# Altium footprint library connecteurs.PcbLib: 162 footprints (part 6 of 11)
Each footprint in its own frame and in the unit in brackets; x right, y up, seen from the top. Pads: shape width x height; smd on the part's side, far side on the other; paste and mask are expansions set on the pad; w line width, h text height; cw(c..) or ccw(c..) is an arc to the next point about the centre after c.
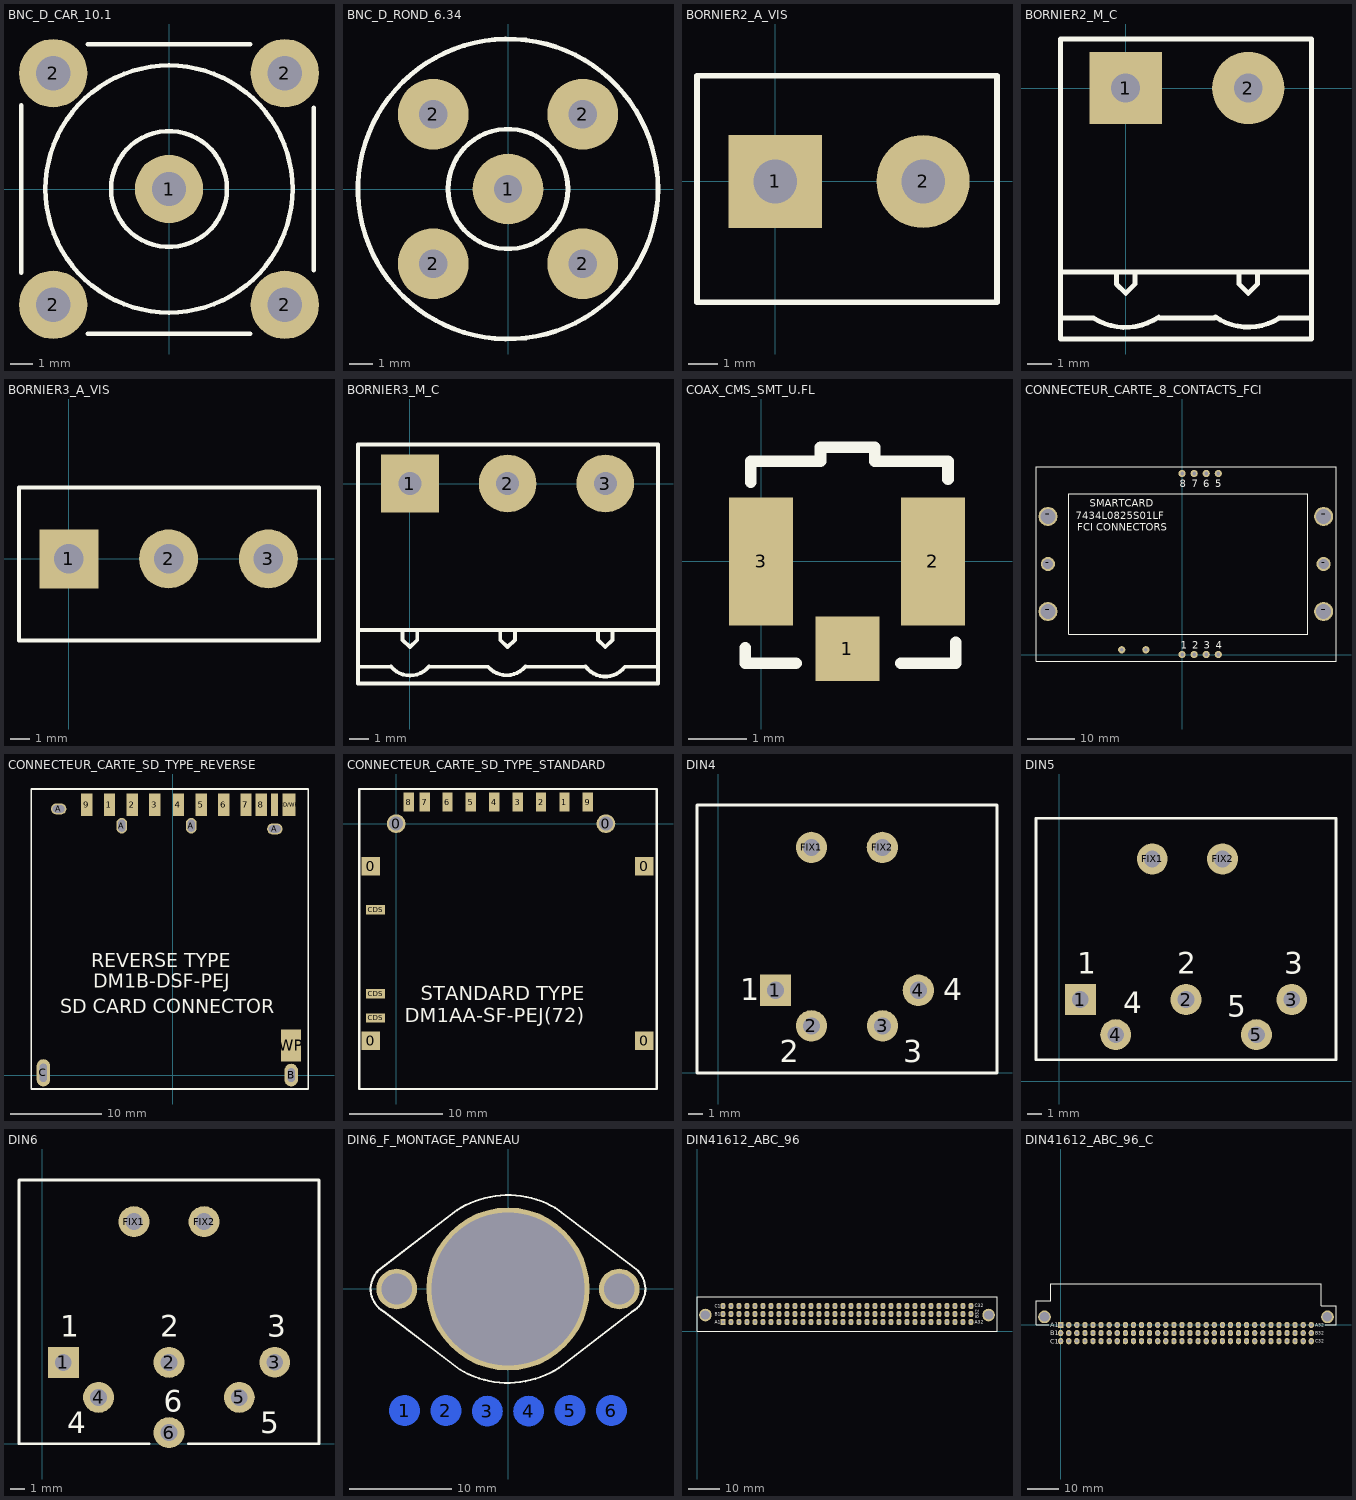
[diagram p5: the footprints below, top view; thin cyan lines are the x and y axes]

## BNC_D_CAR_10.1 [mm] "EMBASE BNC CARREE ;  DROITE ; 50R ; DIAMETRE = 9.7 mm ; ESPACEMENT BROCHES GND = 10.1 mm"
height 14
pads (5):
  round 3 hole 1.5: 1(0,0) 2(-5.08,-5.08) 2(-5.08,5.08) 2(5.08,-5.08) 2(5.08,5.08)
Top Overlay:
  circle w0.2: c0,0 r2.54
  circle w0.2: c0,0 r5.42
  lines w0.2: -6.477,-3.683 -6.477,3.683 ; -3.556,-6.35 3.556,-6.35 ; -3.556,6.35 3.556,6.35 ; 6.35,-3.556 6.35,3.556
3D body: height 22.5, standoff -4, extent -6,-6.1 6,5.9

## BNC_D_ROND_6.34 [mm] "EMBASE BNC RONDE ;  DROITE ; 50R ; DIAMETRE = 9.7 mm ; ESPACEMENT BROCHES GND = 6.34 mm"
height 13.5
pads (5):
  round 3 hole 1.2: 1(0,0) 2(-3.17,-3.17) 2(-3.17,3.17) 2(3.17,-3.17) 2(3.17,3.17)
Top Overlay:
  circle w0.2: c0,0 r6.36
  circle w0.2: c0,0 r2.54
3D body: height 17.95, standoff -4.4, extent -5.49,-5.38 5.49,5.6

## BORNIER2_A_VIS [mm] "BORNIER 2 PLOTS A VIS ; VERTICAL ; ESPACEMENT BROCHES = 5.08mm"
height 10
pads (2):
  rect 3.2x3.2 hole 1.5: 1(0,0)
  round 3.2 hole 1.5: 2(5.08,0)
Top Overlay:
  lines w0.2: -2.69,-4.15 7.62,-4.15 7.62,3.63 0.815,3.63 -2.69,3.63 -2.69,0.358 -2.69,-1.42 -2.69,-4.15
3D body: height 10, standoff -4, extent -2.5,-4 7.5,3.5

## BORNIER2_M_C [mm] "BORNIER 2 PLOTS ; MALE ; COUDE ; ESPACEMENT BROCHES = 5.08mm"
height 8.3
pads (2):
  rect 3x3 hole 1.2: 1(0,0)
  round 3 hole 1.2: 2(5.08,0)
Top Overlay:
  lines w0.2: -2.7,-9.525 -1.323,-9.525 ; -2.7,-7.62 7.7,-7.62 ; -1.323,-9.536 ccw(c-0.013,-7.493) 1.37,-9.486 ; -0.381,-7.62 -0.381,-8.128 0,-8.509 0.381,-8.128 0.381,-7.62 ; 1.397,-9.525 3.683,-9.525 ; 3.713,-9.481 ccw(c5.08,-7.493) 6.359,-9.539 ; 4.699,-7.62 4.699,-8.128 5.08,-8.509 5.461,-8.128 5.461,-7.62 ; 6.35,-9.525 7.7,-9.525 ; -2.7,-10.4 -2.7,2.032 7.7,2.032 7.7,-10.4 -2.7,-10.4
3D body: height 8.47, standoff -4, extent -2.5,-10.2 7.5,1.8

## BORNIER3_A_VIS [mm] "BORNIER 3 PLOTS A VIS ; VERTICAL ; ESPACEMENT BROCHES = 5.08mm"
height 10
pads (3):
  rect 3x3 hole 1.5: 1(0,0)
  round 3 hole 1.5: 2(5.08,0) 3(10.16,0)
Top Overlay:
  lines w0.2: -2.54,-4.16 12.74,-4.16 12.74,3.64 -2.54,3.64 -2.54,-4.16
3D body: height 10, standoff -4, extent -2.4,-4 12.6,3.5

## BORNIER3_M_C [mm] "BORNIER 3 PLOTS ; MALE ; COUDE ; ESPACEMENT BROCHES = 5.08mm"
height 8.3
pads (3):
  rect 3x3 hole 1.2: 1(0,0)
  round 3 hole 1.2: 2(5.08,0) 3(10.16,0)
Top Overlay:
  lines w0.2: -2.7,-10.4 -2.7,2.032 12.9,2.032 12.9,-10.4 -2.667,-10.4 ; -2.7,-9.525 -0.983,-9.525 ; -2.7,-7.62 12.9,-7.62 ; -0.979,-9.522 ccw(c0.002,-8.714) 0.994,-9.507 ; -0.381,-7.62 -0.381,-8.128 0,-8.509 0.381,-8.128 0.381,-7.62 ; 1.016,-9.525 4.064,-9.525 ccw(c5.028,-8.698) 6.008,-9.506 ; 4.699,-7.62 4.699,-8.128 5.08,-8.509 5.461,-8.128 5.461,-7.62 ; 6.031,-9.525 9.103,-9.525 ; 9.13,-9.506 ccw(c10.16,-8.763) 11.176,-9.525 12.9,-9.525 ; 9.779,-7.62 9.779,-8.128 10.16,-8.509 10.541,-8.128 10.541,-7.62
3D body: height 8.6, standoff -3.5, extent -2.52,-10.2 12.72,1.8

## COAX_CMS_SMT_U.FL [mm] "MICRO COAXIAL CMS UFL ; FEMELLE ; DROIT"
height 1.25
pads (3):
  rect 1.1x1.1 smd: 1(1.48,-1.5)
  rect 1.1x2.2 smd: 2(2.95,0) 3(0,0)
Top Overlay:
  lines w0.2: -0.27,-1.48 -0.27,-1.75 0.6,-1.75 ; -0.18,1.36 -0.18,1.72 1.02,1.72 1.02,1.96 1.95,1.96 1.95,1.72 3.21,1.72 3.21,1.41 ; 2.4,-1.75 3.34,-1.75 3.34,-1.39
3D body: height 1.25, standoff -0.01, extent 0,-1.5 3,1.6

## CONNECTEUR_CARTE_8_CONTACTS_FCI [mm] "CONNECTEUR DE CARTE ; 8 CONTACTS ; MALE ; A SOUDER ; PAS = 2.54 mm"
height 9
pads (16):
  round 1.524 hole 0.762: 1(0,0) 2(2.54,0) 3(5.08,0) 4(7.62,0) 5(7.62,38.1) 6(5.08,38.1) 7(2.54,38.1) 8(0,38.1) -(-12.7,1) -(-7.62,1)
  round 4 hole 3.2: -(-28.22,9.05) -(-28.22,29.05) -(29.78,9.05) -(29.78,29.05)
  round 3 hole 2.2: -(-28.22,19.05) -(29.78,19.05)
Top Overlay:
  lines w0.2: -30.734,-1.397 -30.734,39.497 32.385,39.497 32.385,-1.397 -30.734,-1.397 ; -23.876,4.318 -23.876,33.782 26.416,33.782 26.416,4.318 -23.876,4.318
  text "SMARTCARD" at -19.431,31.115 h1.52
  text "8" at -0.508,35.179 h1.52
  text "7" at 2.032,35.179 h1.52
  text "6" at 4.445,35.179 h1.52
  text "5" at 6.985,35.179 h1.52
  text "4" at 7.112,1.27 h1.52
  text "3" at 4.572,1.27 h1.52
  text "2" at 2.159,1.27 h1.52
  text "1" at -0.254,1.27 h1.52
  text "7434L0825S01LF" at -22.352,28.448 h1.52
  text "FCI CONNECTORS" at -22.098,26.035 h1.52

## CONNECTEUR_CARTE_SD_TYPE_REVERSE [mm] "CONNECTEUR MEMOIRE SD REVERSE ; 9 CONTACTS ; PAS = 2.5 mm"
height 2.9
pads (18):
  rect 1.25x2.5 smd: 1(-6.97,29.75) 2(-4.47,29.75) 3(-1.97,29.75) 4(0.625,29.75) 5(3.125,29.75) 6(5.625,29.75) 7(8.05,29.75) 8(9.75,29.75) 9(-9.47,29.75)
  oval 1.7x1.2 hole 0.8 slot 1.3 at 0 deg: A(-12.57,29.3) A(11.23,27.1)
  oval 1.2x1.7 hole 0.8 slot 1.3 at 90 deg: A(-5.62,27.45) A(2.03,27.45)
  oval 1.5x2.5 hole 0.8 slot 1.5 at 90 deg: B(13.03,0)
  oval 1.5x3 hole 0.8 slot 2 at 90 deg: C(-14.25,0.25)
  rect 0.8x2.5 smd: CD(11.2,29.75)
  rect 1.4x2.5 smd: CD/WP(12.8,29.75)
  rect 2.2x3.5 smd: WP(13.03,3.27)
Top Overlay:
  lines w0.2: 14.87,-1.53 -15.58,-1.53 -15.58,31.46 -15.55,31.49 14.91,31.49 14.91,-1.52
  text "DM1B-DSF-PEJ" at -8.76,9.61 h1.52
  text "SD CARD CONNECTOR" at -12.39,6.82 h1.52
  text "REVERSE TYPE" at -8.98,11.85 h1.52

## CONNECTEUR_CARTE_SD_TYPE_STANDARD [mm] "CONNECTEUR MEMOIRE SD STANDARD ; 9 CONTACTS ; PAS = 2.5 mm"
height 2.9
pads (18):
  rect 2x2 smd: 0(-2.7,-23.2) 0(-2.7,-4.55) 0(26.5,-23.2) 0(26.5,-4.55)
  round 2 hole 1.5: 0(0,0) 0(22.4,0)
  rect 1.1x2 smd: 1(17.975,2.3) 2(15.475,2.3) 3(12.975,2.3) 4(10.475,2.3) 5(7.975,2.3) 6(5.475,2.3) 7(3.05,2.3) 8(1.35,2.3) 9(20.475,2.3)
  rect 2x1 smd: CDS(-2.2,-20.75) CDS(-2.2,-18.15) CDS(-2.2,-9.2)
Top Overlay:
  lines w0.254: -3.96,-28.34 27.85,-28.34 27.85,3.7 -3.96,3.7 -3.96,-28.34
  text "DM1AA-SF-PEJ(72)" at 0.92,-21.22 h1.52
  text "STANDARD TYPE" at 2.61,-18.85 h1.52
3D body: height 2.9, standoff -0.55, extent -3.17,-28.04 26.83,2.46

## DIN4 [mm] "EMBASE DIN ; 4 CONTACTS ; FEMELLE ; COUDE"
height 21
pads (6):
  rect 2.2x2.2 hole 1.2: 1(4.01,5.79)
  round 2.2 hole 1.2: 2(6.53,3.3) 3(11.51,3.3) 4(14.02,5.79) FIX1(6.53,15.8) FIX2(11.5,15.8)
Top Overlay:
  lines w0.2: -1.49,0 19.53,0 19.53,16.26 19.53,18.77 -1.49,18.77 -1.49,16.42 -1.49,0
  text "1" at 1.524,5.08 h1.52
  text "2" at 4.318,0.762 h1.52
  text "3" at 12.954,0.762 h1.52
  text "4" at 15.748,5.08 h1.52
3D body: height 21.4, standoff -3.5, extent -1.35,2.6 19.35,18.6

## DIN5 [mm] "EMBASE DIN ; 5 CONTACTS ; FEMELLE ; COUDE"
height 21
pads (7):
  rect 2.2x2.2 hole 1.2: 1(1.5,5.8)
  round 2.2 hole 1.2: 2(9.02,5.8) 3(16.54,5.8) 4(4.02,3.3) 5(14.03,3.3) FIX1(6.62,15.8) FIX2(11.62,15.8)
Top Overlay:
  lines w0.2: -1.65,16.26 -1.65,1.524 19.69,1.524 19.69,16.26 19.69,18.69 -1.65,18.69 -1.65,16.26
  text "1" at 1.27,7.624 h1.52
  text "3" at 16.002,7.624 h1.52
  text "2" at 8.382,7.62 h1.52
  text "5" at 11.938,4.572 h1.52
  text "4" at 4.572,4.826 h1.52
3D body: height 21.4, standoff -3.5, extent -1.35,2.8 19.35,18.5

## DIN6 [mm] "EMBASE DIN ; 6 CONTACTS ; FEMELLE ; COUDE"
height 21
pads (8):
  rect 2.2x2.2 hole 1.2: 1(1.5,5.79)
  round 2.2 hole 1.2: 2(9.02,5.79) 3(16.54,5.8) 4(4.01,3.3) 5(14.02,3.3) 6(9.02,0.79) FIX1(6.53,15.8) FIX2(11.514,15.8)
Top Overlay:
  lines w0.2: -1.65,16.26 -1.65,0 7.62,0 ; -1.65,16.26 -1.65,18.77 19.69,18.77 19.69,16.26 19.69,0 10.414,0
  text "6" at 8.636,2.286 h1.52
  text "1" at 1.27,7.624 h1.52
  text "3" at 16.002,7.624 h1.52
  text "2" at 8.382,7.62 h1.52
  text "5" at 15.494,0.762 h1.52
  text "4" at 1.778,0.762 h1.52
3D body: height 21.4, standoff -3.5, extent -1.35,0.6 19.35,18.55

## DIN6_F_MONTAGE_PANNEAU [mm] "CONNECTEUR DIN ; 6 CONTACTS ; FEMELLE ; MONTAGE PANNEAU ; CONNEXIONS AVEC FILS SUR PCB"
height 2
pads (9):
  round 3 smd far side: 1(-10.16,-11.938) 2(-6.096,-11.938) 3(-2.032,-12) 4(2.032,-12) 5(6.096,-11.938) 6(10.16,-11.938)
  round 4 hole 3: ""(-10.922,0) ""(10.922,0)
  round 16 hole 15: ""(0,0)
Top Overlay:
  lines w0.2: -12.725,1.826 ccw(c-10.922,0) -12.211,-2.219 ; -12.723,1.822 -5.021,7.732 cw(c0,0) 4.629,7.973 ; -12.205,-2.211 -4.714,-7.918 ; -4.716,-7.922 ccw(c0,0) 5.021,-7.732 ; 4.636,7.982 12.777,1.779 ; 5.023,-7.736 12.279,-2.168 ; 12.211,-2.219 ccw(c10.922,0) 12.774,1.776
Bottom Overlay:
  lines w0.2: -14.732,-14.732 14.732,-14.732 14.732,9.82 -14.732,9.82 -14.732,-14.732
3D body: height 1.5, standoff -19.25, extent -14.515,-9.5 14.515,9.5

## DIN41612_ABC_96 [mm] "DIN41612 ; 96 CONTACTS ; 3 RANGEES ; MALE ; ESPACEMENT BROCHES = 2.54 mm"
height 11.4
pads (98):
  rect 1.63x2 hole 1: A1(8.25,2.86)
  oval 1.63x2 hole 1: A2(10.79,2.86) A3(13.33,2.86) A4(15.87,2.86) A5(18.41,2.86) A6(20.95,2.86) A7(23.49,2.86) A8(26.03,2.86) A9(28.57,2.86) A10(31.11,2.86) A11(33.65,2.86) A12(36.19,2.86) A13(38.73,2.86) A14(41.27,2.86) A15(43.81,2.86) A16(46.35,2.86) A17(48.89,2.86) A18(51.43,2.86) A19(53.97,2.86) A20(56.51,2.86) A21(59.05,2.86) A22(61.59,2.86) A23(64.13,2.86) A24(66.67,2.86) A25(69.21,2.86) A26(71.75,2.86) A27(74.29,2.86) A28(76.83,2.86) A29(79.37,2.86) A30(81.91,2.86) A31(84.45,2.86) A32(86.99,2.86) B1(8.25,5.4) B2(10.79,5.4) B3(13.33,5.4) B4(15.87,5.4) B5(18.41,5.4) B6(20.95,5.4) B7(23.49,5.4) B8(26.03,5.4) B9(28.57,5.4) B10(31.11,5.4) B11(33.65,5.4) B12(36.19,5.4) B13(38.73,5.4) B14(41.27,5.4) B15(43.81,5.4) B16(46.35,5.4) B17(48.89,5.4) B18(51.43,5.4) B19(53.97,5.4) B20(56.51,5.4) B21(59.05,5.4) B22(61.59,5.4) B23(64.13,5.4) B24(66.67,5.4) B25(69.21,5.4) B26(71.75,5.4) B27(74.29,5.4) B28(76.83,5.4) B29(79.37,5.4) B30(81.91,5.4) B31(84.45,5.4) B32(86.99,5.4) C1(8.25,7.94) C2(10.79,7.94) C3(13.33,7.94) C4(15.87,7.94) C5(18.41,7.94) C6(20.95,7.94) C7(23.49,7.94) C8(26.03,7.94) C9(28.57,7.94) C10(31.11,7.94) C11(33.65,7.94) C12(36.19,7.94) C13(38.73,7.94) C14(41.27,7.94) C15(43.81,7.94) C16(46.35,7.94) C17(48.89,7.94) C18(51.43,7.94) C19(53.97,7.94) C20(56.51,7.94) C21(59.05,7.94) C22(61.59,7.94) C23(64.13,7.94) C24(66.67,7.94) C25(69.21,7.94) C26(71.75,7.94) C27(74.29,7.94) C28(76.83,7.94) C29(79.37,7.94) C30(81.91,7.94) C31(84.45,7.94) C32(86.99,7.94)
  round 4 hole 3: FIX1(2.67,5.08) FIX2(92.58,5.08)
Top Overlay:
  lines w0.2: 0,0 0,10.8 95.25,10.8 95.25,0 0,0
  text "A32" at 88.138,2.286 h1
  text "B32" at 89.408,4.064 h1
  text "C32" at 88.138,7.62 h1
  text "C1" at 5.71,7.432 h1
  text "B1" at 5.71,4.892 h1
  text "A1" at 5.71,2.352 h1
3D body: height 11.6, standoff -4.82, extent 0.2,0.1 95.1,10.7

## DIN41612_ABC_96_C [mm] "DIN41612 ; 96 CONTACTS ; 3 RANGEES; MALE ; COUDE ; ESPACEMENT BROCHES = 2.54 mm"
height 11
pads (98):
  rect 1.63x2 hole 1: A1(0,0)
  oval 1.63x2 hole 1: A2(2.54,0) A3(5.08,0) A4(7.62,0) A5(10.16,0) A6(12.7,0) A7(15.24,0) A8(17.78,0) A9(20.32,0) A10(22.86,0) A11(25.4,0) A12(27.94,0) A13(30.48,0) A14(33.02,0) A15(35.56,0) A16(38.1,0) A17(40.64,0) A18(43.18,0) A19(45.72,0) A20(48.26,0) A21(50.8,0) A22(53.34,0) A23(55.88,0) A24(58.42,0) A25(60.96,0) A26(63.5,0) A27(66.04,0) A28(68.58,0) A29(71.12,0) A30(73.66,0) A31(76.2,0) A32(78.74,0) B1(0,-2.54) B2(2.54,-2.54) B3(5.08,-2.54) B4(7.62,-2.54) B5(10.16,-2.54) B6(12.7,-2.54) B7(15.24,-2.54) B8(17.78,-2.54) B9(20.32,-2.54) B10(22.86,-2.54) B11(25.4,-2.54) B12(27.94,-2.54) B13(30.48,-2.54) B14(33.02,-2.54) B15(35.56,-2.54) B16(38.1,-2.54) B17(40.64,-2.54) B18(43.18,-2.54) B19(45.72,-2.54) B20(48.26,-2.54) B21(50.8,-2.54) B22(53.34,-2.54) B23(55.88,-2.54) B24(58.42,-2.54) B25(60.96,-2.54) B26(63.5,-2.54) B27(66.04,-2.54) B28(68.58,-2.54) B29(71.12,-2.54) B30(73.66,-2.54) B31(76.2,-2.54) B32(78.74,-2.54) C1(0,-5.08) C2(2.54,-5.08) C3(5.08,-5.08) C4(7.62,-5.08) C5(10.16,-5.08) C6(12.7,-5.08) C7(15.24,-5.08) C8(17.78,-5.08) C9(20.32,-5.08) C10(22.86,-5.08) C11(25.4,-5.08) C12(27.94,-5.08) C13(30.48,-5.08) C14(33.02,-5.08) C15(35.56,-5.08) C16(38.1,-5.08) C17(40.64,-5.08) C18(43.18,-5.08) C19(45.72,-5.08) C20(48.26,-5.08) C21(50.8,-5.08) C22(53.34,-5.08) C23(55.88,-5.08) C24(58.42,-5.08) C25(60.96,-5.08) C26(63.5,-5.08) C27(66.04,-5.08) C28(68.58,-5.08) C29(71.12,-5.08) C30(73.66,-5.08) C31(76.2,-5.08) C32(78.74,-5.08)
  round 4 hole 3: FIX1(-5.08,2.54) FIX2(83.82,2.54)
Top Overlay:
  lines w0.2: -3.81,0 -7.75,0 -7.75,7.62 -3.17,7.62 -3.17,12.96 81.91,12.96 81.91,6.096 86.5,6.096 86.5,0 83.16,0
  text "C32" at 80.01,-5.588 h1
  text "B32" at 80.01,-3.048 h1
  text "A32" at 80.01,-0.508 h1
  text "C1" at -3.302,-5.842 h1.52
  text "B1" at -3.302,-3.302 h1.52
  text "A1" at -3.302,-0.762 h1.52
3D body: height 9.5, standoff -2.9, extent -7.6,-5.4 86.4,12.6